# Altium footprint library SWLIB(150721).PcbLib: 348 footprints (part 13 of 22)
Each footprint in its own frame and in the unit in brackets; x right, y up, seen from the top. Pads: shape width x height; smd on the part's side, far side on the other; paste and mask are expansions set on the pad; w line width, h text height; cw(c..) or ccw(c..) is an arc to the next point about the centre after c.
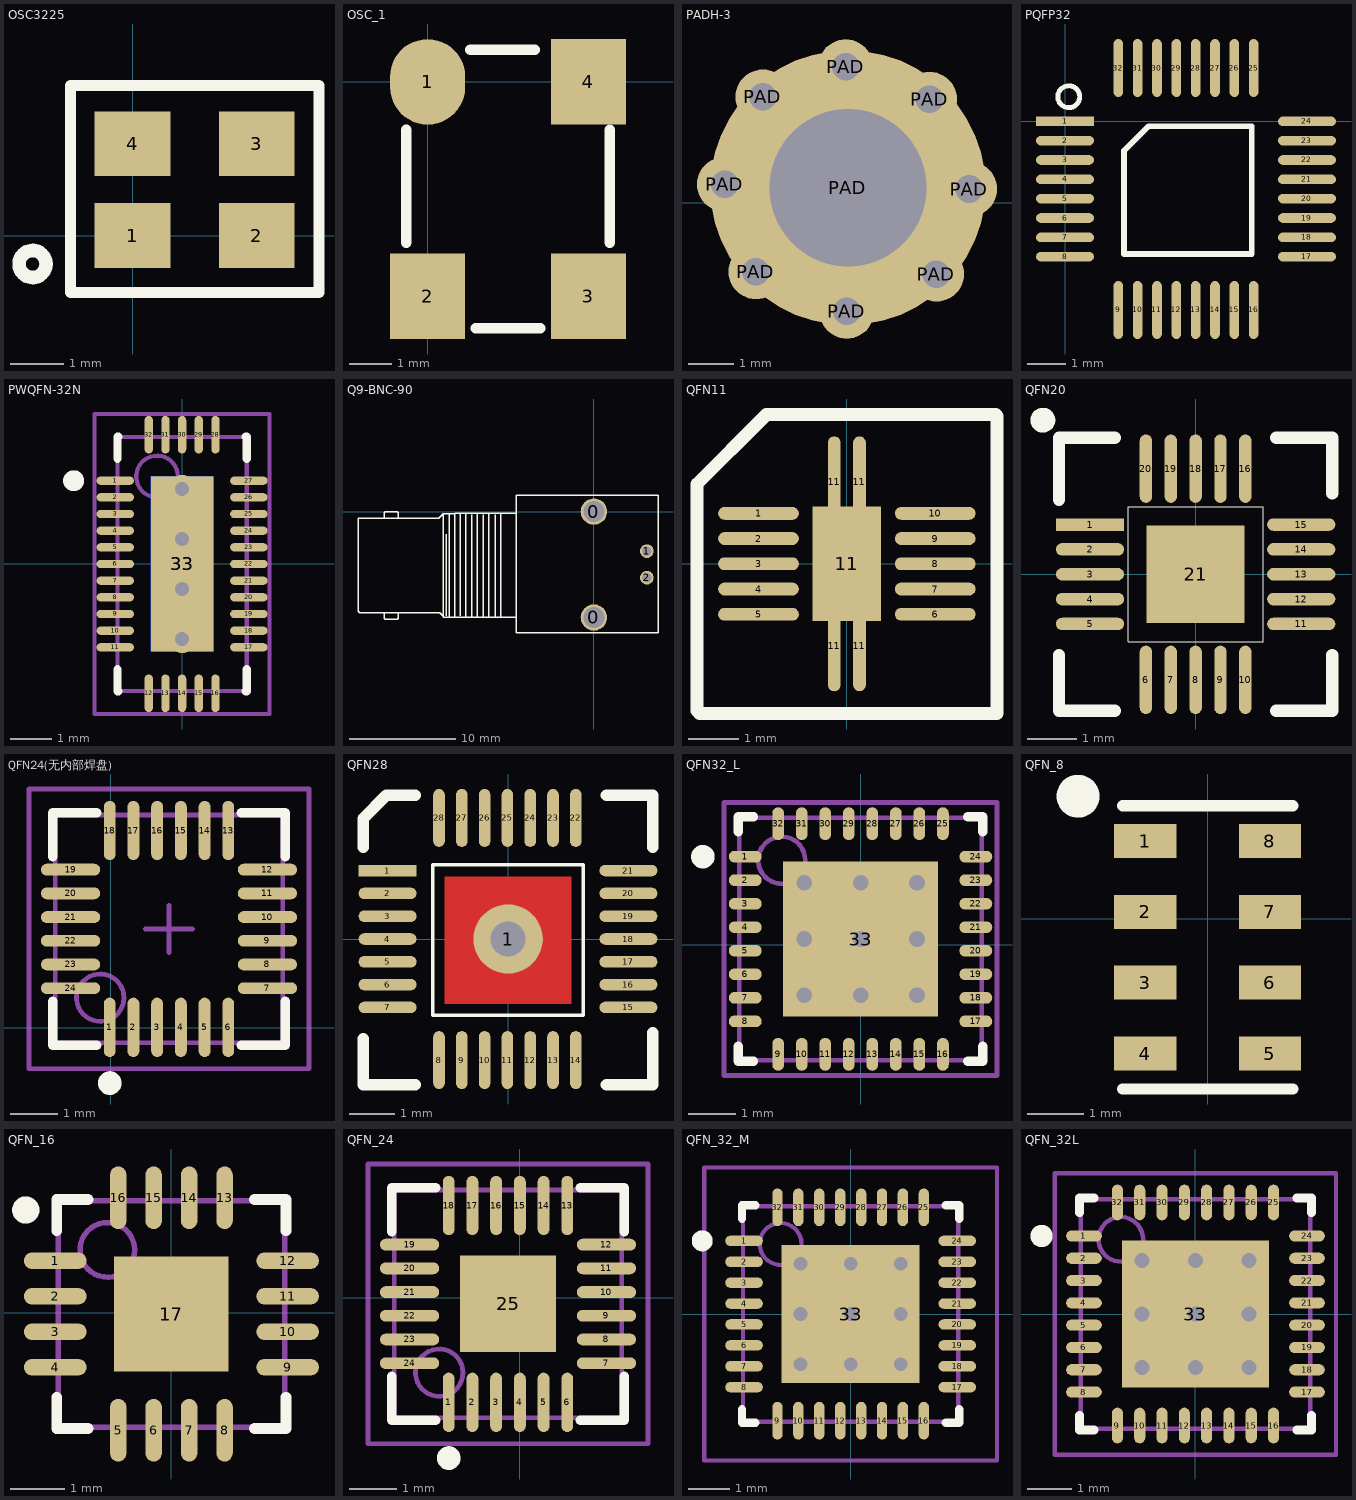
[diagram p12: the footprints below, top view; thin cyan lines are the x and y axes]

## OSC3225 [mil]
pads (4):
  rect 56x48 smd: 1(0,0) 2(92,0) 3(92,68) 4(0,68)
Top Overlay:
  circle w10: c-74,-21 r10
  lines w8: -46,-42 -46,111 138,111 138,-42 -46,-42

## OSC_1 [mil]
pads (4):
  oval 70x80 smd: 1(0,0)
  rect 70x80 smd: 2(0,-200) 3(150,-200) 4(150,0)
Top Overlay:
  lines w10: -20,-150 -20,-45 ; 40,30 100,30 ; 45,-230 105,-230 ; 170,-150 170,-45

## PADH-3 [mm]
pads (9):
  round 1.2 hole 0.6 unplated: PAD(7.95,0.406) PAD(8.636,-1.499) PAD(8.788,2.311) PAD(10.592,2.972) PAD(10.617,-2.362) PAD(12.421,2.261) PAD(12.573,-1.549) PAD(13.293,0.305)
  round 6 hole 3.429 unplated: PAD(10.643,0.33)

## PQFP32 [mm]
pads (32):
  rect 1.5x0.25 smd: 1(0,0)
  oval 1.5x0.25 smd: 2(0,-0.5) 3(0,-1) 4(0,-1.5) 5(0,-2) 6(0,-2.5) 7(0,-3) 8(0,-3.5) 17(6.254,-3.5) 18(6.254,-3) 19(6.254,-2.5) 20(6.254,-2) 21(6.254,-1.5) 22(6.254,-1) 23(6.254,-0.5) 24(6.254,0)
  oval 0.25x1.5 smd: 9(1.377,-4.877) 10(1.877,-4.877) 11(2.377,-4.877) 12(2.877,-4.877) 13(3.377,-4.877) 14(3.877,-4.877) 15(4.377,-4.877) 16(4.877,-4.877) 25(4.877,1.377) 26(4.377,1.377) 27(3.877,1.377) 28(3.377,1.377) 29(2.877,1.377) 30(2.377,1.377) 31(1.877,1.377) 32(1.377,1.377)
Top Overlay:
  circle w0.127: c0.097,0.635 r0.284
  lines w0.152: 1.524,-3.429 4.826,-3.429 4.826,-0.127 2.159,-0.127 1.524,-0.762 1.524,-3.429

## PWQFN-32N [mm] "QFN, 32-Leads, Body 6.1x3.1mm (max), Pitch 0.40mm, IPC Medium Density"
height 0.8
pads (34):
  oval 0.9x0.2 smd: 1(-1.603,2) 2(-1.603,1.6) 3(-1.603,1.2) 4(-1.603,0.8) 5(-1.603,0.4) 6(-1.603,0) 7(-1.603,-0.4) 8(-1.603,-0.8) 9(-1.603,-1.2) 10(-1.603,-1.6) 11(-1.603,-2) 17(1.603,-2) 18(1.603,-1.6) 19(1.603,-1.2) 20(1.603,-0.8) 21(1.603,-0.4) 22(1.603,0) 23(1.603,0.4) 24(1.603,0.8) 25(1.603,1.2) 26(1.603,1.6) 27(1.603,2)
  oval 0.2x0.9 smd: 12(-0.8,-3.103) 13(-0.4,-3.103) 14(0,-3.103) 15(0.4,-3.103) 16(0.8,-3.103) 28(0.8,3.103) 29(0.4,3.103) 30(0,3.103) 31(-0.4,3.103) 32(-0.8,3.103)
  rect 1.5x4.2 smd: 33(0,0)
  rect 1.5x4.2 smd far side: 33(0,0)
via 0,1.8 diameter 0.66 hole 0.33
via 0,0.6 diameter 0.66 hole 0.33
via 0,-0.6 diameter 0.66 hole 0.33
via 0,-1.8 diameter 0.66 hole 0.33
Top Overlay:
  circle w0.25: c-2.603,2 r0.125
  lines w0.2: -1.55,-2.525 -1.55,-3.05 -1.525,-3.05 ; -1.55,2.525 -1.55,3.05 -1.525,3.05 ; 1.525,-3.05 1.55,-3.05 1.55,-2.525 ; 1.525,3.05 1.55,3.05 1.55,2.525
Mechanical 13:
  circle w0.1: c-0.6,2.1 r0.5
  lines w0.1: -1.55,-3.05 -1.55,3.05 1.55,3.05 1.55,-3.05 -1.55,-3.05
Mechanical 15:
  lines w0.1: -0.5,0 0.5,0 ; 0,-0.5 0,0.5 ; -2.1,-3.6 -2.1,3.6 2.1,3.6 2.1,-3.6 -2.1,-3.6
3D body: height 0.8, standoff 0.01, extent -1.55,-3.05 1.55,3.05

## Q9-BNC-90 [mm]
pads (4):
  round 2.5 hole 2: 0(0,-10.008) 0(0,0)
  round 1.3 hole 0.9: 1(5.004,-3.734) 2(5.004,-6.248)
Top Overlay:
  lines w0.127: -19.812,-9.652 -19.812,-10.084 -19.736,-10.16 -18.593,-10.16 -18.517,-10.084 -18.517,-9.627 ; -19.812,-0.559 -19.812,-0.102 -19.736,-0.025 -18.593,-0.025 -18.517,-0.102 -18.517,-0.533 ; -14.224,-0.152 -14.249,-0.178 ; -13.97,-9.855 -13.97,-2.134 ; -13.665,-9.881 -13.665,-0.229 ; -13.157,-9.982 -13.157,-0.178 -14.249,-0.178 ; -13.132,-0.152 -7.366,-0.152 ; -12.624,-9.855 -12.624,-0.203 ; -12.116,-9.957 -12.116,-0.152 ; -11.557,-9.931 -11.557,-0.279 ; -11.049,-9.982 -11.049,-0.178 ; -10.439,-9.931 -10.439,-0.279 ; -9.931,-10.008 -9.931,-0.203 ; -9.347,-9.931 -9.347,-0.279 ; -8.788,-10.008 -8.788,-0.203 ; -7.341,-9.982 -14.224,-9.982 ; -14.249,-0.178 -14.249,-9.957 -14.224,-9.982 ; -14.249,-0.178 -14.681,-0.61 -22.225,-0.61 -22.301,-0.686 -22.301,-9.423 -22.149,-9.576 -14.554,-9.576 -14.224,-9.906 -14.224,-9.982 ; -7.341,-11.451 -7.341,1.549 6.059,1.549 6.059,-11.451 -7.341,-11.451

## QFN11 [mm]
pads (15):
  oval 1.6x0.254 smd: 1(-1.75,1) 2(-1.75,0.5) 3(-1.75,0) 4(-1.75,-0.5) 5(-1.75,-1) 6(1.75,-1) 7(1.75,-0.5) 8(1.75,0) 9(1.75,0.5) 10(1.75,1)
  oval 0.254x1.8 smd: 11(-0.25,-1.625) 11(-0.25,1.625) 11(0.25,-1.625) 11(0.25,1.625)
  rect 1.36x2.27 smd: 11(0,0)
Top Overlay:
  lines w0.254: 2.593,-2.962 2.974,-2.962 2.974,2.905 ; 2.949,-2.937 2.924,-2.962 -2.918,-2.962 -2.969,-2.912 -2.969,1.584 -1.648,2.905 -1.598,2.956 2.949,2.956 2.974,2.93 2.974,2.753

## QFN20 [mil]
pads (21):
  rect 55x10 smd: 1(-85,40)
  oval 55x10 smd: 2(-85,20) 3(-85,0) 4(-85,-20) 5(-85,-40) 11(85,-40) 12(85,-20) 13(85,0) 14(85,20) 15(85,40)
  oval 10x55 smd: 6(-40,-85) 7(-20,-85) 8(0,-85) 9(20,-85) 10(40,-85) 16(40,85) 17(20,85) 18(0,85) 19(-20,85) 20(-40,85)
  rect 78.74x78.74 smd: 21(0,0)
Top Overlay:
  circle w10: c-123,124 r5
  lines w1: -54.27,54.31 -54.27,-54.27 54.27,-54.27 54.27,54.27 -53.93,54.27
  lines w10: -110,-65 -110,-110 -65,-110 ; -110,60 -110,85 -110,110 -65,110 ; 65,-110 110,-110 110,-65 ; 65,110 110,110 110,65

## QFN24(无内部焊盘) [mm]
pads (24):
  oval 0.25x1.25 smd: 1(-0.023,0.008) 2(0.477,0.008) 3(0.977,0.008) 4(1.477,0.008) 5(1.977,0.008) 6(2.477,0.008) 13(2.477,4.158) 14(1.977,4.158) 15(1.477,4.158) 16(0.977,4.158) 17(0.477,4.158) 18(-0.023,4.158)
  oval 1.25x0.25 smd: 7(3.302,0.833) 8(3.302,1.333) 9(3.302,1.833) 10(3.302,2.333) 11(3.302,2.833) 12(3.302,3.333) 19(-0.848,3.333) 20(-0.848,2.833) 21(-0.848,2.333) 22(-0.848,1.833) 23(-0.848,1.333) 24(-0.848,0.833)
Top Overlay:
  circle w0.25: c-0.023,-1.167 r0.125
  lines w0.2: -1.223,0.558 -1.223,-0.367 -0.298,-0.367 ; -1.223,3.608 -1.223,4.533 -0.298,4.533 ; 2.752,-0.367 3.677,-0.367 3.677,0.558 ; 2.752,4.533 3.677,4.533 3.677,3.608
Mechanical 13:
  circle w0.1: c-0.223,0.633 r0.5
  lines w0.1: -1.173,-0.317 3.627,-0.317 3.627,4.483 -1.173,4.483 -1.173,-0.317
Mechanical 15:
  lines w0.1: 0.727,2.083 1.727,2.083 ; 1.227,1.583 1.227,2.583 ; -1.723,-0.867 4.177,-0.867 4.177,5.033 -1.723,5.033 -1.723,-0.867
3D body "User Library-QFN24-0_5.STEP": height 1, standoff 0, extent -0.773,0.083 3.227,4.083

## QFN28 [mil]
pads (29):
  rect 50x10 smd: 1(-104,59.05)
  round 60 hole 30: 1(0,0)
  oval 50x10 smd: 2(-104,39.37) 3(-104,19.68) 4(-104,0) 5(-104,-19.68) 6(-104,-39.37) 7(-104,-59.05) 15(103.98,-59.05) 16(103.98,-39.37) 17(103.98,-19.68) 18(103.98,0) 19(103.98,19.68) 20(103.98,39.37) 21(103.98,59.05)
  oval 10x50 smd: 8(-59.57,-104.49) 9(-39.88,-104.49) 10(-20.2,-104.49) 11(-0.51,-104.49) 12(19.17,-104.49) 13(38.86,-104.49) 14(58.54,-104.49) 22(58.54,104.49) 23(38.86,104.49) 24(19.17,104.49) 25(-0.51,104.49) 26(-20.2,104.49) 27(-39.88,104.49) 28(-59.57,104.49)
Top Layer:
  rectangle: -55,-55.95 55,54.05
Top Overlay:
  lines w3: -65,-65.94 65,-65.94 65,64.06 -65,64.06 -65,-65.94
  lines w10: -125,-125.94 -125,-85.94 ; -125,79.06 -125,104.06 -105,124.06 -80,124.06 ; -123,-125.94 -80,-125.94 ; 85,-125.94 125,-125.94 125,-80.94 ; 85,124.06 125,124.06 125,79.06

## QFN32_L [mm]
pads (33):
  oval 0.7x0.25 smd: 1(-2.45,1.877) 2(-2.45,1.377) 3(-2.45,0.877) 4(-2.45,0.377) 5(-2.45,-0.123) 6(-2.45,-0.623) 7(-2.45,-1.123) 8(-2.45,-1.623) 17(2.45,-1.623) 18(2.45,-1.123) 19(2.45,-0.623) 20(2.45,-0.123) 21(2.45,0.377) 22(2.45,0.877) 23(2.45,1.377) 24(2.45,1.877)
  oval 0.25x0.7 smd: 9(-1.75,-2.323) 10(-1.25,-2.323) 11(-0.75,-2.323) 12(-0.25,-2.323) 13(0.25,-2.323) 14(0.75,-2.323) 15(1.25,-2.323) 16(1.75,-2.323) 25(1.75,2.577) 26(1.25,2.577) 27(0.75,2.577) 28(0.25,2.577) 29(-0.25,2.577) 30(-0.75,2.577) 31(-1.25,2.577) 32(-1.75,2.577)
  rect 3.3x3.3 smd: 33(0,0.127)
via 1.2,-1.073 diameter 0.66 hole 0.33
via 0,-1.073 diameter 0.66 hole 0.33
via -1.2,-1.073 diameter 0.66 hole 0.33
via 1.2,0.127 diameter 0.66 hole 0.33
via 0,0.127 diameter 0.66 hole 0.33
via -1.2,0.127 diameter 0.66 hole 0.33
via 1.2,1.327 diameter 0.66 hole 0.33
via 0,1.327 diameter 0.66 hole 0.33
via -1.2,1.327 diameter 0.66 hole 0.33
Top Overlay:
  circle w0.25: c-3.35,1.877 r0.125
  lines w0.2: -2.6,-2.148 -2.6,-2.473 -2.275,-2.473 ; -2.6,2.402 -2.6,2.727 -2.275,2.727 ; 2.275,-2.473 2.6,-2.473 2.6,-2.148 ; 2.275,2.727 2.6,2.727 2.6,2.402
Mechanical 13:
  circle w0.1: c-1.675,1.802 r0.5
  lines w0.1: -2.575,-2.448 2.575,-2.448 2.575,2.702 -2.575,2.702 -2.575,-2.448
Mechanical 15:
  lines w0.1: -0.5,0.127 0.5,0.127 ; 0,-0.373 0,0.627 ; -2.9,-2.773 2.9,-2.773 2.9,3.027 -2.9,3.027 -2.9,-2.773
3D body: height 0.8, standoff 0, extent -2.575,-2.448 2.575,2.702

## QFN_8 [mm]
height 5.7
pads (8):
  rect 1.1x0.6 smd: 1(-1.1,1.367) 2(-1.1,0.117) 3(-1.1,-1.133) 4(-1.1,-2.383) 5(1.1,-2.383) 6(1.1,-1.133) 7(1.1,0.117) 8(1.1,1.367)
Top Overlay:
  circle w0.5: c-2.286,2.159 r0.127
  lines w0.2: -1.5,-3.008 1.5,-3.008 ; -1.5,1.992 1.5,1.992
3D body "User Library-ms5611.STEP": height 1.01, standoff -0.05, extent -1.55,-3.008 1.55,1.992

## QFN_16 [mm]
height 0.65
pads (17):
  oval 1.15x0.3 smd: 1(-2.129,0.95) 2(-2.129,0.3) 3(-2.129,-0.35) 4(-2.129,-1) 9(2.129,-1) 10(2.129,-0.35) 11(2.129,0.3) 12(2.129,0.95)
  oval 0.3x1.15 smd: 5(-0.975,-2.154) 6(-0.325,-2.154) 7(0.325,-2.154) 8(0.975,-2.154) 13(0.975,2.104) 14(0.325,2.104) 15(-0.325,2.104) 16(-0.975,2.104)
  rect 2.1x2.1 smd: 17(0,-0.025)
Top Overlay:
  circle w0.25: c-2.667,1.88 r0.125
  lines w0.2: -2.1,-1.55 -2.1,-2.125 -1.525,-2.125 ; -2.1,1.5 -2.1,2.075 -1.525,2.075 ; 1.525,-2.125 2.1,-2.125 2.1,-1.55 ; 1.525,2.075 2.1,2.075 2.1,1.5
Mechanical 13:
  circle w0.1: c-1.175,1.15 r0.5
  lines w0.1: -2.075,-2.1 2.075,-2.1 2.075,2.05 -2.075,2.05 -2.075,-2.1
Mechanical 15:
  lines w0.1: -0.5,-0.025 0.5,-0.025 ; 0,-0.525 0,0.475
3D body "User Library-QFN-16-1.STEP": height 0.85, standoff 0, extent -2.1,-2.125 2.07,2.045

## QFN_24 [mm]
height 5.7
pads (25):
  oval 0.25x1.25 smd: 1(-1.496,-2.202) 2(-0.996,-2.202) 3(-0.496,-2.202) 4(0.004,-2.202) 5(0.504,-2.202) 6(1.004,-2.202) 13(1.004,1.948) 14(0.504,1.948) 15(0.004,1.948) 16(-0.496,1.948) 17(-0.996,1.948) 18(-1.496,1.948)
  oval 1.25x0.25 smd: 7(1.829,-1.377) 8(1.829,-0.877) 9(1.829,-0.377) 10(1.829,0.123) 11(1.829,0.623) 12(1.829,1.123) 19(-2.321,1.123) 20(-2.321,0.623) 21(-2.321,0.123) 22(-2.321,-0.377) 23(-2.321,-0.877) 24(-2.321,-1.377)
  rect 2.032x2.032 smd: 25(-0.246,-0.127)
Top Overlay:
  circle w0.25: c-1.496,-3.377 r0.125
  lines w0.2: -2.696,-1.652 -2.696,-2.577 -1.771,-2.577 ; -2.696,1.398 -2.696,2.323 -1.771,2.323 ; 1.279,-2.577 2.204,-2.577 2.204,-1.652 ; 1.279,2.323 2.204,2.323 2.204,1.398
Mechanical 13:
  circle w0.1: c-1.696,-1.577 r0.5
  lines w0.1: -2.646,-2.527 2.154,-2.527 2.154,2.273 -2.646,2.273 -2.646,-2.527
Mechanical 15:
  lines w0.1: -0.746,-0.127 0.254,-0.127 ; -0.246,-0.627 -0.246,0.373 ; -3.196,-3.077 2.704,-3.077 2.704,2.823 -3.196,2.823 -3.196,-3.077
3D body "User Library-QFN24-0_5.STEP": height 1, standoff 0, extent -2.246,-2.127 1.754,1.873

## QFN_32_M [mm]
pads (33):
  oval 0.9x0.25 smd: 1(-2.55,1.75) 2(-2.55,1.25) 3(-2.55,0.75) 4(-2.55,0.25) 5(-2.55,-0.25) 6(-2.55,-0.75) 7(-2.55,-1.25) 8(-2.55,-1.75) 17(2.55,-1.75) 18(2.55,-1.25) 19(2.55,-0.75) 20(2.55,-0.25) 21(2.55,0.25) 22(2.55,0.75) 23(2.55,1.25) 24(2.55,1.75)
  oval 0.25x0.9 smd: 9(-1.75,-2.55) 10(-1.25,-2.55) 11(-0.75,-2.55) 12(-0.25,-2.55) 13(0.25,-2.55) 14(0.75,-2.55) 15(1.25,-2.55) 16(1.75,-2.55) 25(1.75,2.55) 26(1.25,2.55) 27(0.75,2.55) 28(0.25,2.55) 29(-0.25,2.55) 30(-0.75,2.55) 31(-1.25,2.55) 32(-1.75,2.55)
  rect 3.3x3.3 smd: 33(0,0)
via -1.2,1.2 diameter 0.66 hole 0.33
via 0,1.2 diameter 0.66 hole 0.33
via 1.2,1.2 diameter 0.66 hole 0.33
via -1.2,0 diameter 0.66 hole 0.33
via 0,0 diameter 0.66 hole 0.33
via 1.2,0 diameter 0.66 hole 0.33
via -1.2,-1.2 diameter 0.66 hole 0.33
via 0,-1.2 diameter 0.66 hole 0.33
via 1.2,-1.2 diameter 0.66 hole 0.33
Top Overlay:
  circle w0.25: c-3.55,1.75 r0.125
  lines w0.2: -2.6,-2.275 -2.6,-2.6 -2.275,-2.6 ; -2.6,2.275 -2.6,2.6 -2.275,2.6 ; 2.275,-2.6 2.6,-2.6 2.6,-2.275 ; 2.275,2.6 2.6,2.6 2.6,2.275
Mechanical 13:
  circle w0.1: c-1.675,1.675 r0.5
  lines w0.1: -2.575,-2.575 -2.575,2.575 2.575,2.575 2.575,-2.575 -2.575,-2.575
Mechanical 15:
  lines w0.1: -0.5,0 0.5,0 ; 0,-0.5 0,0.5 ; -3.5,-3.5 -3.5,3.5 3.5,3.5 3.5,-3.5 -3.5,-3.5
3D body: height 0.8, standoff 0, extent -2.575,-2.575 2.575,2.575

## QFN_32L [mm]
pads (33):
  oval 0.8x0.25 smd: 1(-2.5,1.75) 2(-2.5,1.25) 3(-2.5,0.75) 4(-2.5,0.25) 5(-2.5,-0.25) 6(-2.5,-0.75) 7(-2.5,-1.25) 8(-2.5,-1.75) 17(2.5,-1.75) 18(2.5,-1.25) 19(2.5,-0.75) 20(2.5,-0.25) 21(2.5,0.25) 22(2.5,0.75) 23(2.5,1.25) 24(2.5,1.75)
  oval 0.25x0.8 smd: 9(-1.75,-2.5) 10(-1.25,-2.5) 11(-0.75,-2.5) 12(-0.25,-2.5) 13(0.25,-2.5) 14(0.75,-2.5) 15(1.25,-2.5) 16(1.75,-2.5) 25(1.75,2.5) 26(1.25,2.5) 27(0.75,2.5) 28(0.25,2.5) 29(-0.25,2.5) 30(-0.75,2.5) 31(-1.25,2.5) 32(-1.75,2.5)
  rect 3.3x3.3 smd: 33(0,0)
via 1.2,-1.2 diameter 0.66 hole 0.33
via 0,-1.2 diameter 0.66 hole 0.33
via -1.2,-1.2 diameter 0.66 hole 0.33
via 1.2,0 diameter 0.66 hole 0.33
via 0,0 diameter 0.66 hole 0.33
via -1.2,0 diameter 0.66 hole 0.33
via 1.2,1.2 diameter 0.66 hole 0.33
via 0,1.2 diameter 0.66 hole 0.33
via -1.2,1.2 diameter 0.66 hole 0.33
Top Overlay:
  circle w0.25: c-3.45,1.75 r0.125
  lines w0.2: -2.6,-2.275 -2.6,-2.6 -2.275,-2.6 ; -2.6,2.275 -2.6,2.6 -2.275,2.6 ; 2.275,-2.6 2.6,-2.6 2.6,-2.275 ; 2.275,2.6 2.6,2.6 2.6,2.275
Mechanical 13:
  circle w0.1: c-1.675,1.675 r0.5
  lines w0.1: -2.575,-2.575 2.575,-2.575 2.575,2.575 -2.575,2.575 -2.575,-2.575
Mechanical 15:
  lines w0.1: -0.5,0 0.5,0 ; 0,-0.5 0,0.5 ; -3.15,-3.15 3.15,-3.15 3.15,3.15 -3.15,3.15 -3.15,-3.15
3D body: height 0.8, standoff 0, extent -2.575,-2.575 2.575,2.575